# Altium footprint library eLIB.PcbLib: 206 footprints (part 1 of 13)
Each footprint in its own frame and in the unit in brackets; x right, y up, seen from the top. Pads: shape width x height; smd on the part's side, far side on the other; paste and mask are expansions set on the pad; w line width, h text height; cw(c..) or ccw(c..) is an arc to the next point about the centre after c.
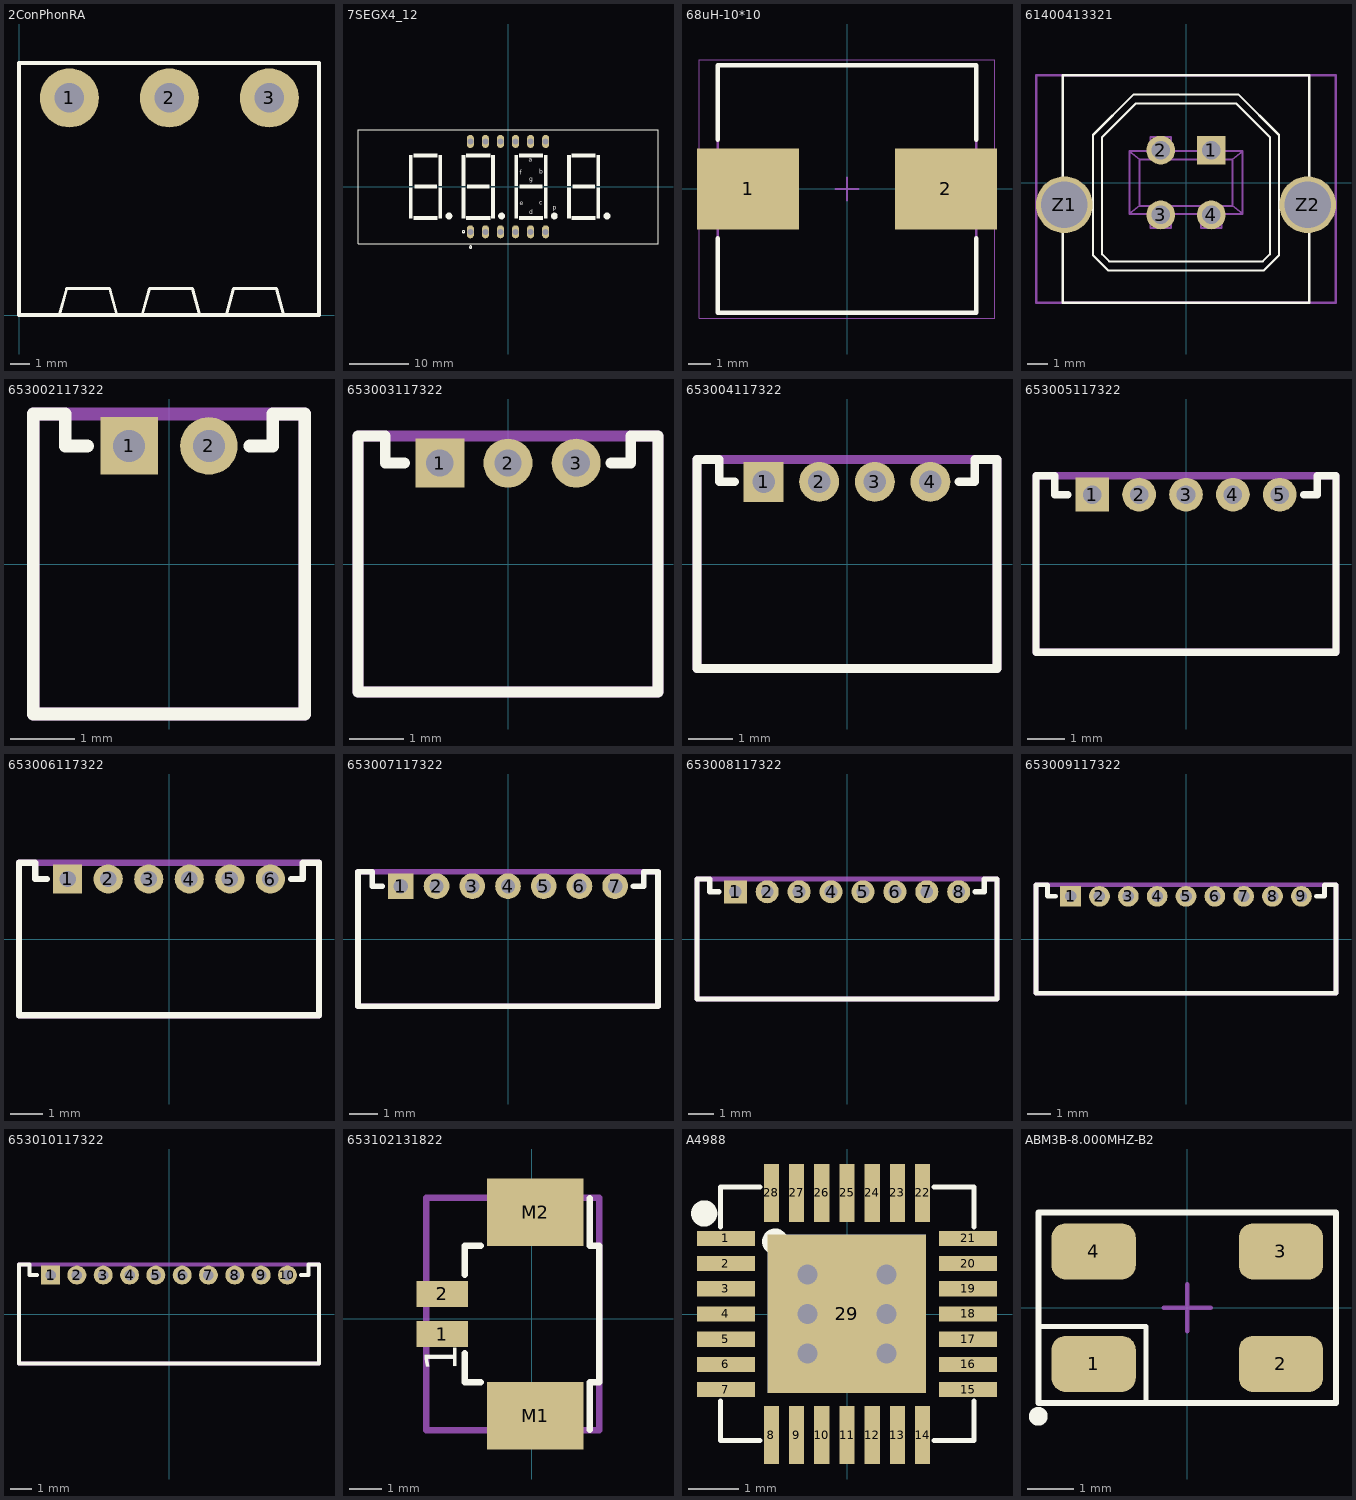
[diagram p0: the footprints below, top view; thin cyan lines are the x and y axes]

## 2ConPhonRA [mm]
height 0.88
pads (3):
  round 3 hole 1.5: 1(2.563,11.04) 2(7.643,11.04) 3(12.723,11.04)
Top Overlay:
  lines w0.15: 2.064,0.028 2.425,1.348 4.607,1.348 ; 4.61,1.345 4.971,0.025 ; 6.266,0.028 6.627,1.348 8.809,1.348 ; 8.812,1.345 9.173,0.025 ; 10.543,0.028 10.904,1.348 13.086,1.348 ; 13.089,1.345 13.45,0.025
  lines w0.2: 0,0 0,12.827 15.25,12.827 15.25,0 0,0

## 7SEGX4_12 [mm] "7SEG 4DIGIT 12pin Pitch: 2.54mm    5641 0.56\", 19X50.3mm"
pads (12):
  oval 1.2x2.2 hole 1: 1(-6.35,-7.62) 2(-3.81,-7.62) 3(-1.27,-7.62) 4(1.27,-7.62) 5(3.81,-7.62) 6(6.35,-7.62) 7(6.35,7.62) 8(3.81,7.62) 9(1.27,7.62) 10(-1.27,7.62) 11(-3.81,7.62) 12(-6.35,7.62)
Top Overlay:
  circle w0.2: c-6.3,-10.2 r0.2
  circle w0.2: c-7.5,-7.6 r0.2
  circle w0.635: c7.81,-4.953 r0.254
  circle w0.635: c-1.08,-4.953 r0.254
  circle w0.635: c16.7,-4.953 r0.254
  circle w0.635: c-9.97,-4.953 r0.254
  rectangle: -6.922,-0.33 -3.112,0.33
  rectangle: 1.079,-5.334 1.714,-0.127
  rectangle: 1.079,0.127 1.714,5.334
  rectangle: 6.032,0.127 6.667,5.334
  rectangle: 6.032,-5.334 6.667,-0.127
  rectangle: 1.841,4.953 5.905,5.588
  rectangle: 1.841,-5.588 5.905,-4.953
  rectangle: 1.968,-0.33 5.778,0.33
  rectangle: -7.049,-5.588 -2.985,-4.953
  rectangle: -7.049,4.953 -2.985,5.588
  rectangle: -2.858,-5.334 -2.223,-0.127
  rectangle: -2.858,0.127 -2.223,5.334
  rectangle: -7.811,0.127 -7.176,5.334
  rectangle: -7.811,-5.334 -7.176,-0.127
  rectangle: 10.858,-0.33 14.668,0.33
  rectangle: 10.731,-5.588 14.795,-4.953
  rectangle: 10.731,4.953 14.795,5.588
  rectangle: 14.922,-5.334 15.557,-0.127
  rectangle: 14.922,0.127 15.557,5.334
  rectangle: 9.969,0.127 10.604,5.334
  rectangle: 9.969,-5.334 10.604,-0.127
  rectangle: -16.701,-5.334 -16.066,-0.127
  rectangle: -16.701,0.127 -16.066,5.334
  rectangle: -11.748,0.127 -11.113,5.334
  rectangle: -11.748,-5.334 -11.113,-0.127
  rectangle: -15.939,4.953 -11.875,5.588
  rectangle: -15.939,-5.588 -11.875,-4.953
  rectangle: -15.812,-0.33 -12.002,0.33
  lines w0.2: -25.3,-9.6 -25.3,9.6 25.3,9.6 25.3,-9.6 -25.3,-9.6
  text "a" at 3.492,4.191 h0.76
  text "f" at 1.968,2.032 h0.76
  text "d" at 3.619,-4.699 h0.76
  text "c" at 5.27,-3.048 h0.76
  text "e" at 1.968,-3.175 h0.76
  text "b" at 5.27,2.159 h0.76
  text "p" at 7.556,-3.937 h0.76
  text "g" at 3.619,0.889 h0.76
3D body "User Library-C-564 (7 segment 4 digit LED display).step": height 8, standoff -6.2, extent -25.2,-9.5 25.2,9.5

## 68uH-10*10 [mm] "INDUCTOR-150mA"
height 3.5
pads (2):
  rect 4.55x3.6 smd: 1(-4.4,0) 2(4.4,0)
Top Overlay:
  lines w0.2: -5.75,-2.2 -5.75,-5.5 5.75,-5.5 5.75,-2.2 ; -5.75,2.2 -5.75,5.5 5.75,5.5 5.75,2.2
Mechanical 13:
  lines w0.1: -5.75,-5.5 5.75,-5.5 5.75,5.5 -5.75,5.5 -5.75,-5.5
Mechanical 15:
  lines w0.05: -6.575,-5.75 6.575,-5.75 6.575,5.75 -6.575,5.75 -6.575,-5.75
  lines w0.1: -0.5,0 0.5,0 ; 0,-0.5 0,0.5
3D body: height 3.5, standoff 0, extent -5.75,-5.5 5.75,5.5

## 61400413321 [mm] "F Str 04p Btype vertical USB"
height 16.1
pads (6):
  rect 1.428x1.428 hole 0.92: 1(1.25,1.6)
  round 1.428 hole 0.92: 2(-1.25,1.6) 3(-1.25,-1.6) 4(1.25,-1.6)
  round 2.8 hole 2.3: Z1(-6.02,-1.1) Z2(6.02,-1.1)
Top Overlay:
  lines w0.102: -4.6,-3.6 -3.85,-4.35 3.85,-4.35 4.6,-3.6 4.6,2.35 2.6,4.35 -2.6,4.35 -4.6,2.35 -4.6,-3.6 ; -4.15,-3.55 -3.8,-3.9 3.8,-3.9 4.15,-3.55 4.15,2.25 2.5,3.9 -2.5,3.9 -4.15,2.25 -4.15,-3.55
  lines w0.127: -6.1,-5.945 -6.1,5.305 6.1,5.305 6.1,-5.945 -6.1,-5.945
Mechanical 13:
  lines w0.102: -1.75,-1.55 -1.75,-2.25 -0.75,-2.25 -0.75,-1.55 ; -1.75,1.55 -1.75,2.25 -0.75,2.25 -0.75,1.55 ; 0.75,-1.55 0.75,-2.25 1.75,-2.25 1.75,-1.55 ; 0.75,1.55 0.75,2.25 1.75,2.25 1.75,1.55 ; -2.8,-1.55 2.8,-1.55 ; -2.8,-1.55 -2.8,1.55 ; -2.8,-1.55 -2.3,-1.15 ; -2.8,1.55 2.8,1.55 ; -2.8,1.55 -2.3,1.15 ; -2.3,-1.15 2.3,-1.15 ; -2.3,-1.15 -2.3,1.15 ; -2.3,1.15 2.3,1.15 ; 2.3,-1.15 2.3,1.15 ; 2.3,-1.15 2.8,-1.55 ; 2.3,1.15 2.8,1.55 ; 2.8,-1.55 2.8,1.55
Mechanical 15:
  lines w0.127: -7.398,-5.945 7.4,-5.945 7.4,5.305 -7.398,5.305 -7.398,-5.945
3D body "61400413321.stp": height 16.11, standoff -4.21, extent -7.398,-5.945 7.398,5.255

## 653002117322 [mm] "1.25mm Male Horizontal Shrouded Header, 2p"
height 3.5
pads (2):
  rect 0.9x0.9 hole 0.5: 1(-0.625,1.85)
  round 0.9 hole 0.5: 2(0.625,1.85)
Top Overlay:
  lines w0.2: -1.275,1.85 -1.625,1.85 -1.625,2.35 -2.125,2.35 -2.125,-2.35 2.125,-2.35 2.125,2.35 1.625,2.35 1.625,1.85 1.265,1.85
Mechanical 13:
  lines w0.2: -2.125,-2.35 2.125,-2.35 2.125,2.35 -2.125,2.35 -2.125,-2.35
3D body "653002117322.stp": height 3.55, standoff -2.25, extent -2.125,-2.35 2.125,2.35

## 653003117322 [mm] "1.25mm Male Horizontal Shrouded Header, 3p"
height 3.5
pads (3):
  rect 0.9x0.9 hole 0.5: 1(-1.25,1.85)
  round 0.9 hole 0.5: 2(0,1.85) 3(1.25,1.85)
Top Overlay:
  lines w0.2: -1.9,1.85 -2.25,1.85 -2.25,2.35 -2.75,2.35 -2.75,-2.35 2.75,-2.35 2.75,2.35 2.25,2.35 2.25,1.85 1.89,1.85
Mechanical 13:
  lines w0.2: -2.75,-2.35 2.75,-2.35 2.75,2.35 -2.75,2.35 -2.75,-2.35
3D body "653003117322.stp": height 3.55, standoff -2.25, extent -2.75,-2.35 2.75,2.35

## 653004117322 [mm] "1.25mm Male Horizontal Shrouded Header, 4p"
height 3.5
pads (4):
  rect 0.9x0.9 hole 0.5: 1(-1.875,1.85)
  round 0.9 hole 0.5: 2(-0.625,1.85) 3(0.625,1.85) 4(1.875,1.85)
Top Overlay:
  lines w0.2: -2.525,1.85 -2.875,1.85 -2.875,2.35 -3.375,2.35 -3.375,-2.35 3.375,-2.35 3.375,2.35 2.875,2.35 2.875,1.85 2.515,1.85
Mechanical 13:
  lines w0.2: -3.375,-2.35 3.375,-2.35 3.375,2.35 -3.375,2.35 -3.375,-2.35
3D body "653004117322.stp": height 3.55, standoff -2.25, extent -3.375,-2.35 3.375,2.35

## 653005117322 [mm] "1.25mm Male Horizontal Shrouded Header, 5p"
height 3.5
pads (5):
  rect 0.9x0.9 hole 0.5: 1(-2.5,1.85)
  round 0.9 hole 0.5: 2(-1.25,1.85) 3(0,1.85) 4(1.25,1.85) 5(2.5,1.85)
Top Overlay:
  lines w0.2: -3.15,1.85 -3.5,1.85 -3.5,2.35 -4,2.35 -4,-2.35 4,-2.35 4,2.35 3.5,2.35 3.5,1.85 3.14,1.85
Mechanical 13:
  lines w0.2: -4,-2.35 -4,2.35 4,2.35 4,-2.35 -4,-2.35
3D body "653005117322.stp": height 3.55, standoff -2.25, extent -4,-2.35 4,2.35

## 653006117322 [mm] "1.25mm Male Horizontal Shrouded Header, 6p"
height 3.5
pads (6):
  rect 0.9x0.9 hole 0.5: 1(-3.125,1.85)
  round 0.9 hole 0.5: 2(-1.875,1.85) 3(-0.625,1.85) 4(0.625,1.85) 5(1.875,1.85) 6(3.125,1.85)
Top Overlay:
  lines w0.2: -3.775,1.85 -4.125,1.85 -4.125,2.35 -4.625,2.35 -4.625,-2.35 4.625,-2.35 4.625,2.35 4.125,2.35 4.125,1.85 3.765,1.85
Mechanical 13:
  lines w0.2: -4.625,-2.35 -4.625,2.35 4.625,2.35 4.625,-2.35 -4.625,-2.35
3D body "653006117322.stp": height 3.55, standoff -2.25, extent -4.625,-2.35 4.625,2.35

## 653007117322 [mm] "1.25mm Male Horizontal Shrouded Header, 7p"
height 3.5
pads (7):
  rect 0.9x0.9 hole 0.5: 1(-3.75,1.85)
  round 0.9 hole 0.5: 2(-2.5,1.85) 3(-1.25,1.85) 4(0,1.85) 5(1.25,1.85) 6(2.5,1.85) 7(3.75,1.85)
Top Overlay:
  lines w0.2: -4.4,1.85 -4.75,1.85 -4.75,2.35 -5.25,2.35 -5.25,-2.35 5.25,-2.35 5.25,2.35 4.75,2.35 4.75,1.85 4.39,1.85
Mechanical 13:
  lines w0.2: -5.25,-2.35 5.25,-2.35 5.25,2.35 -5.25,2.35 -5.25,-2.35
3D body "653007117322.stp": height 3.55, standoff -2.25, extent -5.25,-2.35 5.25,2.35

## 653008117322 [mm] "1.25mm Male Horizontal Shrouded Header, 8p"
height 3.5
pads (8):
  rect 0.9x0.9 hole 0.5: 1(-4.375,1.85)
  round 0.9 hole 0.5: 2(-3.125,1.85) 3(-1.875,1.85) 4(-0.625,1.85) 5(0.625,1.85) 6(1.875,1.85) 7(3.125,1.85) 8(4.375,1.85)
Top Overlay:
  lines w0.2: -5.025,1.85 -5.375,1.85 -5.375,2.35 -5.875,2.35 -5.875,-2.35 5.875,-2.35 5.875,2.35 5.375,2.35 5.375,1.85 5.015,1.85
Mechanical 13:
  lines w0.2: -5.875,-2.35 5.875,-2.35 5.875,2.35 -5.875,2.35 -5.875,-2.35
3D body "653008117322.stp": height 3.55, standoff -2.25, extent -5.875,-2.35 5.875,2.35

## 653009117322 [mm] "1.25mm Male Horizontal Shrouded Header, 9p"
height 3.5
pads (9):
  rect 0.9x0.9 hole 0.5: 1(-5,1.85)
  round 0.9 hole 0.5: 2(-3.75,1.85) 3(-2.5,1.85) 4(-1.25,1.85) 5(0,1.85) 6(1.25,1.85) 7(2.5,1.85) 8(3.75,1.85) 9(5,1.85)
Top Overlay:
  lines w0.2: -5.65,1.85 -6,1.85 -6,2.35 -6.5,2.35 -6.5,-2.35 6.5,-2.35 6.5,2.35 6,2.35 6,1.85 5.64,1.85
Mechanical 13:
  lines w0.2: -6.5,-2.35 6.5,-2.35 6.5,2.35 -6.5,2.35 -6.5,-2.35
3D body "653009117322.stp": height 3.55, standoff -2.25, extent -6.5,-2.35 6.5,2.35

## 653010117322 [mm] "1.25mm Male Horizontal Shrouded Header, 10p"
height 3.5
pads (10):
  rect 0.9x0.9 hole 0.5: 1(-5.625,1.85)
  round 0.9 hole 0.5: 2(-4.375,1.85) 3(-3.125,1.85) 4(-1.875,1.85) 5(-0.625,1.85) 6(0.625,1.85) 7(1.875,1.85) 8(3.125,1.85) 9(4.375,1.85) 10(5.625,1.85)
Top Overlay:
  lines w0.2: -6.275,1.85 -6.625,1.85 -6.625,2.35 -7.125,2.35 -7.125,-2.35 7.125,-2.35 7.125,2.35 6.625,2.35 6.625,1.85 6.265,1.85
Mechanical 13:
  lines w0.2: -7.125,-2.35 -7.125,2.35 7.125,2.35 7.125,-2.35 -7.125,-2.35
3D body "653010117322.stp": height 3.55, standoff -2.25, extent -7.125,-2.35 7.125,2.35

## 653102131822 [mm]
pads (4):
  rect 1.6x0.81 smd: 1(-2.788,-0.475) 2(-2.788,0.775)
  rect 3x2.1 smd: M1(0.112,-3.025) M2(0.112,3.325)
Top Overlay:
  lines w0.2: -2.088,-1.075 -2.088,-1.975 -1.588,-1.975 ; -2.088,1.375 -2.088,2.275 -1.588,2.275 ; 1.812,-3.455 1.812,-1.975 2.112,-1.975 2.112,2.275 1.812,2.275 1.812,3.755
  text "1" at -2.338,-1.65 h1
Mechanical 13:
  lines w0.2: -3.288,-3.475 2.112,-3.475 2.112,3.775 -3.288,3.775 -3.288,-3.475
3D body "653102131822.stp": height 3.43, standoff 0.02, extent -3.288,-3.475 2.112,3.775

## A4988 [mm] "stepper motor driver"
height 0.2
pads (29):
  rect 1.15x0.3 smd: 1(-2.4,1.5) 2(-2.4,1) 3(-2.4,0.5) 4(-2.4,0) 5(-2.4,-0.5) 6(-2.4,-1) 7(-2.4,-1.5) 15(2.4,-1.5) 16(2.4,-1) 17(2.4,-0.5) 18(2.4,0) 19(2.4,0.5) 20(2.4,1) 21(2.4,1.5)
  rect 0.3x1.15 smd: 8(-1.5,-2.4) 9(-1,-2.4) 10(-0.5,-2.4) 11(0,-2.4) 12(0.5,-2.4) 13(1,-2.4) 14(1.5,-2.4) 22(1.5,2.4) 23(1,2.4) 24(0.5,2.4) 25(0,2.4) 26(-0.5,2.4) 27(-1,2.4) 28(-1.5,2.4)
  rect 3.15x3.15 smd: 29(-0.005,0.005)
via 0.783,0 diameter 0.8 hole 0.4
via -0.783,0 diameter 0.8 hole 0.4
via 0.783,0.783 diameter 0.8 hole 0.4
via 0.783,-0.783 diameter 0.8 hole 0.4
via -0.783,0.783 diameter 0.8 hole 0.4
via -0.783,-0.783 diameter 0.8 hole 0.4
Bottom Layer:
  region: 1.57,1.58 -1.58,1.58 -1.58,-1.57 1.57,-1.57
Top Overlay:
  circle w0.3: c-2.832,1.995 r0.11
  circle w0.3: c-1.422,1.435 r0.11
  lines w0.1: -2.512,-1.722 -2.512,-2.512 -1.722,-2.512 ; -2.512,1.727 -2.512,2.518 -1.722,2.518 ; 1.727,-2.512 2.518,-2.512 2.518,-1.722 ; 1.727,2.518 2.518,2.518 2.518,1.727
3D body "User Library-QFN28-0_5.STEP": height 1, standoff 0, extent -2.498,-2.498 2.503,2.503

## ABM3B-8.000MHZ-B2 [mm]
height 0.9
pads (4):
  rrect50% 1.8x1.2 smd: 1(-2,-1.2) 2(2,-1.2) 3(2,1.2) 4(-2,1.2)
Top Overlay:
  circle w0.3: c-3.18,-2.32 r0.05
  lines w0.1: -3.193,-0.4 -0.883,-0.4 -0.883,-2.015
  lines w0.127: -3.175,-2.032 -3.175,2.032 3.175,2.032 3.175,-2.032 -3.175,-2.032
Mechanical 15:
  lines w0.05: -3.175,-2.032 3.175,-2.032 3.175,2.032 -3.175,2.032 -3.175,-2.032
  lines w0.1: -0.5,0 0.5,0 ; 0,-0.5 0,0.5
3D body "User Library-ABM3B.STEP": height 1.2, standoff 0.1, extent -2.548,-1.606 2.452,1.594